# Altium footprint library 04.连接器件.pcb.PCBLIB: 363 footprints (part 9 of 23)
Each footprint in its own frame and in the unit in brackets; x right, y up, seen from the top. Pads: shape width x height; smd on the part's side, far side on the other; paste and mask are expansions set on the pad; w line width, h text height; cw(c..) or ccw(c..) is an arc to the next point about the centre after c.
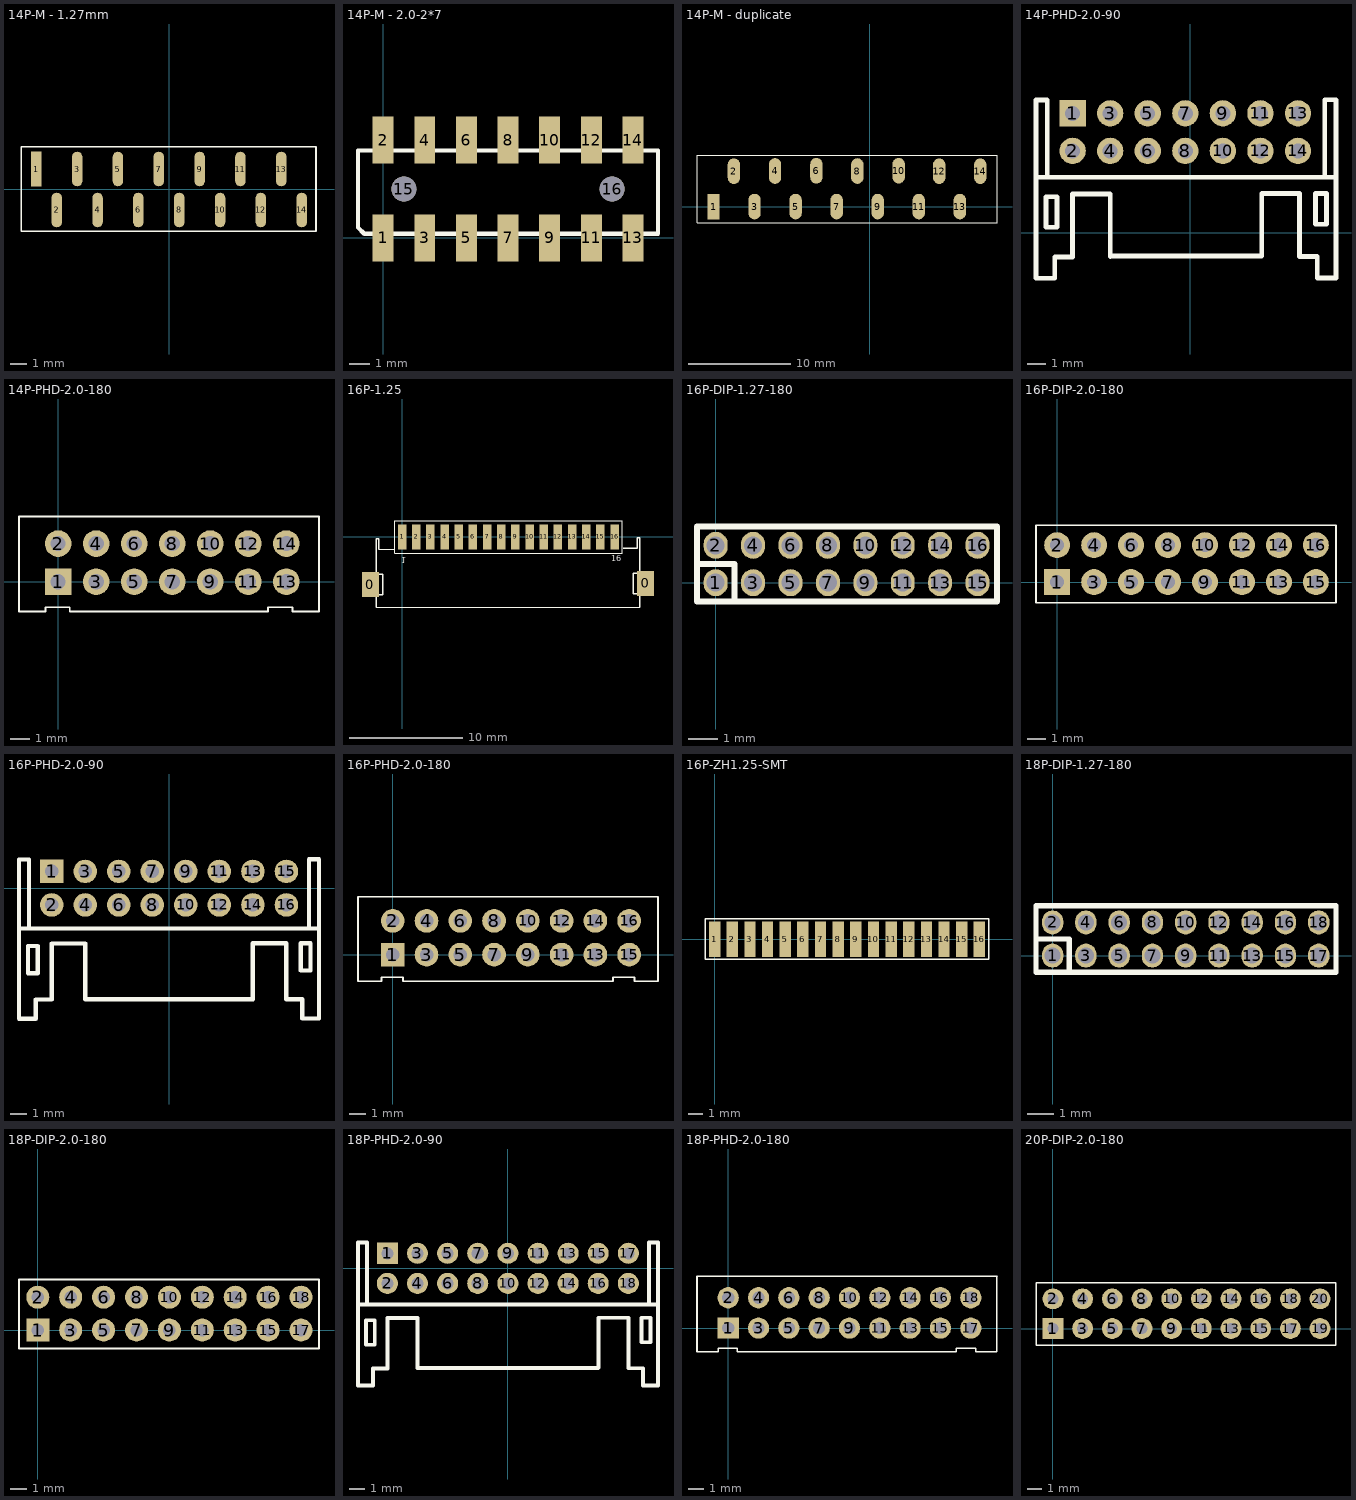
[diagram p8: the footprints below, top view; thin cyan lines are the x and y axes]

## 14P-M - 1.27mm [mm]
pads (14):
  rect 0.65x2.15 smd: 1(-8.255,1.275)
  oval 0.65x2.15 smd: 2(-6.985,-1.275) 3(-5.715,1.275) 4(-4.445,-1.275) 5(-3.175,1.275) 6(-1.905,-1.275) 7(-0.635,1.275) 8(0.635,-1.275) 9(1.905,1.275) 10(3.175,-1.275) 11(4.445,1.275) 12(5.715,-1.275) 13(6.985,1.275) 14(8.255,-1.275)
TopOverlay:
  lines w0.1: -9.198,-2.599 9.146,-2.599 9.146,2.661 -9.198,2.661 -9.198,-2.599
3D body: height 4.6, standoff 0, extent -9.198,-2.599 9.146,2.661

## 14P-M - 2.0-2*7 [mm]
pads (16):
  rect 1x2.25 smd: 1(0,0) 2(0,4.7) 3(2,0) 4(2,4.7) 5(4,0) 6(4,4.7) 7(6,0) 8(6,4.7) 9(8,0) 10(8,4.7) 11(10,0) 12(10,4.7) 13(12,0) 14(12,4.7)
  round 1.2 hole 1.2: 15(1,2.35) 16(11,2.35)
TopOverlay:
  lines w0.2: -1.2,0.5 -0.9,0.2 13.2,0.2 13.2,4.2 -1.2,4.2 -1.2,0.5

## 14P-M - duplicate [mm]
pads (14):
  rect 1.2x2.5 smd: 1(-15.24,0)
  oval 1.2x2.5 smd: 2(-13.255,3.451) 3(-11.24,0) 4(-9.243,3.469) 5(-7.24,0) 6(-5.217,3.492) 7(-3.24,0) 8(-1.229,3.46) 9(0.76,0) 10(2.802,3.497) 11(4.76,0) 12(6.749,3.451) 13(8.76,0) 14(10.749,3.451)
TopOverlay:
  lines w0.1: -16.848,-1.567 -16.848,4.995 12.38,4.995 12.38,-1.567 -16.848,-1.567
3D body: height 4.5, standoff 0, extent -16.848,-0.663 12.38,4.174

## 14P-PHD-2.0-90 [mm]
pads (14):
  rect 1.4x1.4 hole 0.8: 1(-6.251,6.362)
  round 1.4 hole 0.8: 2(-6.251,4.362) 3(-4.251,6.362) 4(-4.251,4.362) 5(-2.251,6.362) 6(-2.251,4.362) 7(-0.251,6.362) 8(-0.251,4.362) 9(1.749,6.362) 10(1.749,4.362) 11(3.749,6.362) 12(3.749,4.362) 13(5.749,6.362) 14(5.749,4.362)
TopOverlay:
  lines w0.254: -8.078,2.958 -7.628,2.958 ; -7.601,2.958 -7.601,7.073 -8.201,7.073 -8.201,-2.427 -7.201,-2.427 -7.201,-1.283 -6.251,-1.283 -6.251,2.069 -4.251,2.069 -4.251,-1.258 ; -7.593,2.958 7.272,2.958 ; -4.237,-1.243 3.824,-1.243 3.824,2.084 5.824,2.084 5.824,-1.269 6.774,-1.269 6.774,-2.412 7.774,-2.412 7.774,7.088 7.174,7.088 7.174,2.973 ; 5.633,2.958 7.732,2.958 ; -7.668,0.291 -7.084,0.291 -7.084,1.917 -7.668,1.917 -7.668,0.291 ; 6.682,0.458 7.266,0.458 7.266,2.084 6.682,2.084 6.682,0.458
3D body: height 5, standoff 0, extent -8.201,-2.427 7.774,7.073

## 14P-PHD-2.0-180 [mm]
pads (14):
  rect 1.4x1.4 hole 0.8: 1(0,0)
  round 1.4 hole 0.8: 2(0,2) 3(2,0) 4(2,2) 5(4,0) 6(4,2) 7(6,0) 8(6,2) 9(8,0) 10(8,2) 11(10,0) 12(10,2) 13(12,0) 14(12,2)
TopOverlay:
  lines w0.1: 11.042,-1.575 11.042,-1.346 12.312,-1.346 12.312,-1.575 13.709,-1.575 13.709,3.43 ; 11.049,-1.575 0.61,-1.575 0.61,-1.346 -0.66,-1.346 -0.66,-1.575 -2.057,-1.575 -2.057,3.425 13.716,3.43
3D body "IDC14(2.0).STEP": height 6.5, standoff -2.6, extent -2.159,-1.626 13.841,3.374

## 16P-1.25 [mm]
pads (18):
  rect 1.5x2.2 smd: 0(-2.8,-4.2) 0(21.49,-4.11)
  rect 0.75x2.2 smd: 1(0,0) 2(1.25,0) 3(2.5,0) 4(3.75,0) 5(5,0) 6(6.25,0) 7(7.5,0) 8(8.75,0) 9(10,0) 10(11.25,0) 11(12.5,0) 12(13.75,0) 13(15,0) 14(16.25,0) 15(17.5,0) 16(18.75,0)
TopOverlay:
  lines w0.1: -2.3,-6.2 21,-6.2 ; -2.07,-1.1 -0.66,-1.1 ; -0.66,-1.448 19.431,-1.448 19.431,1.422 -0.66,1.422 -0.66,-1.448
  lines w0.127: -2.3,-6.2 -2.3,-5.1 -1.7,-5.1 -1.7,-3.3 -2.3,-3.3 -2.3,-0.17 -2.07,-0.17 -2.07,-1.1 ; 19.5,-1 20.76,-1 20.76,-0.08 20.99,-0.08 20.99,-3.21 20.39,-3.21 20.39,-5.01 20.99,-5.01 20.99,-6.2
  text "1" at -0.1,-1.8 h0.5
  text "16" at 18.466,-2.144 h0.5
3D body: height 3.2, standoff 0.2, extent -2.8,-6.2 21.5,0.5

## 16P-DIP-1.27-180 [mil]
pads (16):
  oval 32x36 hole 24: 1(0,0) 2(0,50) 3(50,0) 4(50,50) 5(100,0) 6(100,50) 7(150,0) 8(150,50) 9(200,0) 10(200,50) 11(250,0) 12(250,50) 13(300,0) 14(300,50) 15(350,0) 16(350,50)
TopOverlay:
  lines w8: -25,25 25,25 25,-25 ; -25,-25 -25,75 376,75 376,-25 -25,-25

## 16P-DIP-2.0-180 [mm]
pads (16):
  rect 1.4x1.4 hole 0.75: 1(0,0)
  round 1.4 hole 0.75: 2(0,2) 3(2,0) 4(2,2) 5(4,0) 6(4,2) 7(6,0) 8(6,2) 9(8,0) 10(8,2) 11(10,0) 12(10,2) 13(12,0) 14(12,2) 15(14,0) 16(14,2)
TopOverlay:
  lines w0.1: -1.143,-1.118 -1.143,3.073 15.088,3.073 15.088,-1.118 -1.143,-1.118
3D body "DIP16(2.0)排针.": height 8, standoff -2.6, extent -1.041,-1.041 14.959,2.959

## 16P-PHD-2.0-90 [mm]
pads (16):
  rect 1.4x1.4 hole 0.8: 1(-7,1)
  round 1.4 hole 0.8: 2(-7,-1) 3(-5,1) 4(-5,-1) 5(-3,1) 6(-3,-1) 7(-1,1) 8(-1,-1) 9(1,1) 10(1,-1) 11(3,1) 12(3,-1) 13(5,1) 14(5,-1) 15(7,1) 16(7,-1)
TopOverlay:
  lines w0.254: -8.827,-2.404 -8.377,-2.404 ; -8.35,-2.404 -8.35,1.711 -8.95,1.711 -8.95,-7.789 -7.95,-7.789 -7.95,-6.645 -7,-6.645 -7,-3.293 -5,-3.293 -5,-6.62 5,-6.62 ; -8.342,-2.404 8.342,-2.404 8.901,-2.404 ; 4.977,-6.62 4.992,-6.605 4.992,-3.278 6.992,-3.278 6.992,-6.631 7.942,-6.631 7.942,-7.774 8.942,-7.774 8.942,1.726 8.342,1.726 8.342,-2.389 ; -8.417,-5.071 -8.417,-3.445 -7.832,-3.445 -7.832,-5.071 -8.417,-5.071 ; 7.85,-4.904 7.85,-3.278 8.434,-3.278 8.434,-4.904 7.85,-4.904
3D body: height 5, standoff 0, extent -8.95,-7.789 8.942,1.711

## 16P-PHD-2.0-180 [mm]
pads (16):
  rect 1.4x1.4 hole 0.8: 1(0,0)
  round 1.4 hole 0.8: 2(0,2) 3(2,0) 4(2,2) 5(4,0) 6(4,2) 7(6,0) 8(6,2) 9(8,0) 10(8,2) 11(10,0) 12(10,2) 13(12,0) 14(12,2) 15(14,0) 16(14,2)
TopOverlay:
  lines w0.1: 13.042,-1.575 13.042,-1.346 14.312,-1.346 14.312,-1.575 15.709,-1.575 15.709,3.43 ; 13.056,-1.575 0.61,-1.575 0.61,-1.346 -0.66,-1.346 -0.66,-1.575 -2.057,-1.575 -2.057,3.425 15.672,3.431
3D body "IDC16(2.0).STEP": height 6.5, standoff -2.6, extent -2.184,-1.626 15.816,3.374

## 16P-ZH1.25-SMT [mm]
pads (16):
  rect 0.8x2.5 smd: 1(0,0) 2(1.25,0) 3(2.5,0) 4(3.75,0) 5(5,0) 6(6.25,0) 7(7.5,0) 8(8.75,0) 9(10,0) 10(11.25,0) 11(12.5,0) 12(13.75,0) 13(15,0) 14(16.25,0) 15(17.5,0) 16(18.75,0)
TopOverlay:
  lines w0.1: -0.66,-1.422 19.431,-1.422 19.431,1.448 -0.66,1.448 -0.66,-1.422

## 18P-DIP-1.27-180 [mil]
pads (18):
  oval 32x36 hole 24: 1(0,0) 2(0,50) 3(50,0) 4(50,50) 5(100,0) 6(100,50) 7(150,0) 8(150,50) 9(200,0) 10(200,50) 11(250,0) 12(250,50) 13(300,0) 14(300,50) 15(350,0) 16(350,50) 17(400,0) 18(400,50)
TopOverlay:
  lines w8: -25,25 25,25 25,-25 ; -25,-25 -25,75 426,75 426,-25 -25,-25

## 18P-DIP-2.0-180 [mm]
pads (18):
  rect 1.4x1.4 hole 0.75: 1(0,0)
  round 1.4 hole 0.75: 2(0,2) 3(2,0) 4(2,2) 5(4,0) 6(4,2) 7(6,0) 8(6,2) 9(8,0) 10(8,2) 11(10,0) 12(10,2) 13(12,0) 14(12,2) 15(14,0) 16(14,2) 17(16,0) 18(16,2)
TopOverlay:
  lines w0.1: -1.143,-1.118 17.094,-1.118 17.094,3.073 -1.143,3.073 -1.143,-1.118
3D body "DIP18(2.0)排针.": height 8, standoff -2.6, extent -1.041,-1.041 16.959,2.959

## 18P-PHD-2.0-90 [mm]
pads (18):
  rect 1.4x1.4 hole 0.8: 1(-8,1)
  round 1.4 hole 0.8: 2(-8,-1) 3(-6,1) 4(-6,-1) 5(-4,1) 6(-4,-1) 7(-2,1) 8(-2,-1) 9(0,1) 10(0,-1) 11(2,1) 12(2,-1) 13(4,1) 14(4,-1) 15(6,1) 16(6,-1) 17(8,1) 18(8,-1)
TopOverlay:
  lines w0.254: -9.827,-2.404 -9.377,-2.404 ; -9.35,-2.404 -9.35,1.711 -9.95,1.711 -9.95,-7.789 -8.95,-7.789 -8.95,-6.645 -8,-6.645 -8,-3.293 -6,-3.293 -6,-6.62 4,-6.62 6.005,-6.62 6.02,-6.605 6.02,-3.278 8.02,-3.278 8.02,-6.631 8.97,-6.631 8.97,-7.774 9.97,-7.774 9.97,1.726 9.37,1.726 9.37,-2.389 ; -9.342,-2.404 7.95,-2.404 ; 7.829,-2.404 9.929,-2.404 ; -9.417,-5.071 -8.832,-5.071 -8.832,-3.445 -9.417,-3.445 -9.417,-5.071 ; 8.878,-4.904 8.878,-3.278 9.462,-3.278 9.462,-4.904 8.878,-4.904
3D body: height 5, standoff 0, extent -9.95,-7.789 9.978,1.711

## 18P-PHD-2.0-180 [mm]
pads (18):
  rect 1.4x1.4 hole 0.8: 1(0,0)
  round 1.4 hole 0.8: 2(0,2) 3(2,0) 4(2,2) 5(4,0) 6(4,2) 7(6,0) 8(6,2) 9(8,0) 10(8,2) 11(10,0) 12(10,2) 13(12,0) 14(12,2) 15(14,0) 16(14,2) 17(16,0) 18(16,2)
TopOverlay:
  lines w0.1: 15.037,-1.575 0.61,-1.575 0.61,-1.346 -0.66,-1.346 -0.66,-1.575 -2.057,-1.575 -2.057,3.425 17.729,3.432 ; 15.042,-1.575 15.042,-1.346 16.312,-1.346 16.312,-1.575 17.709,-1.575 17.709,3.43
3D body "IDC18(2.0).STEP": height 6.5, standoff -2.6, extent -2.159,-1.549 17.841,3.451

## 20P-DIP-2.0-180 [mm]
pads (20):
  rect 1.4x1.4 hole 0.75: 1(0,0)
  round 1.4 hole 0.75: 2(0,2) 3(2,0) 4(2,2) 5(4,0) 6(4,2) 7(6,0) 8(6,2) 9(8,0) 10(8,2) 11(10,0) 12(10,2) 13(12,0) 14(12,2) 15(14,0) 16(14,2) 17(16,0) 18(16,2) 19(18,0) 20(18,2)
TopOverlay:
  lines w0.1: -1.143,-1.118 -1.143,3.073 19.075,3.073 19.075,-1.118 -1.143,-1.118
3D body "DIP20(2.0)排针.": height 8, standoff -2.6, extent -1.041,-1.016 18.959,2.984